# Altium footprint library Inverter_2kW.PcbLib: 61 footprints (part 3 of 4)
Each footprint in its own frame and in the unit in brackets; x right, y up, seen from the top. Pads: shape width x height; smd on the part's side, far side on the other; paste and mask are expansions set on the pad; w line width, h text height; cw(c..) or ccw(c..) is an arc to the next point about the centre after c.
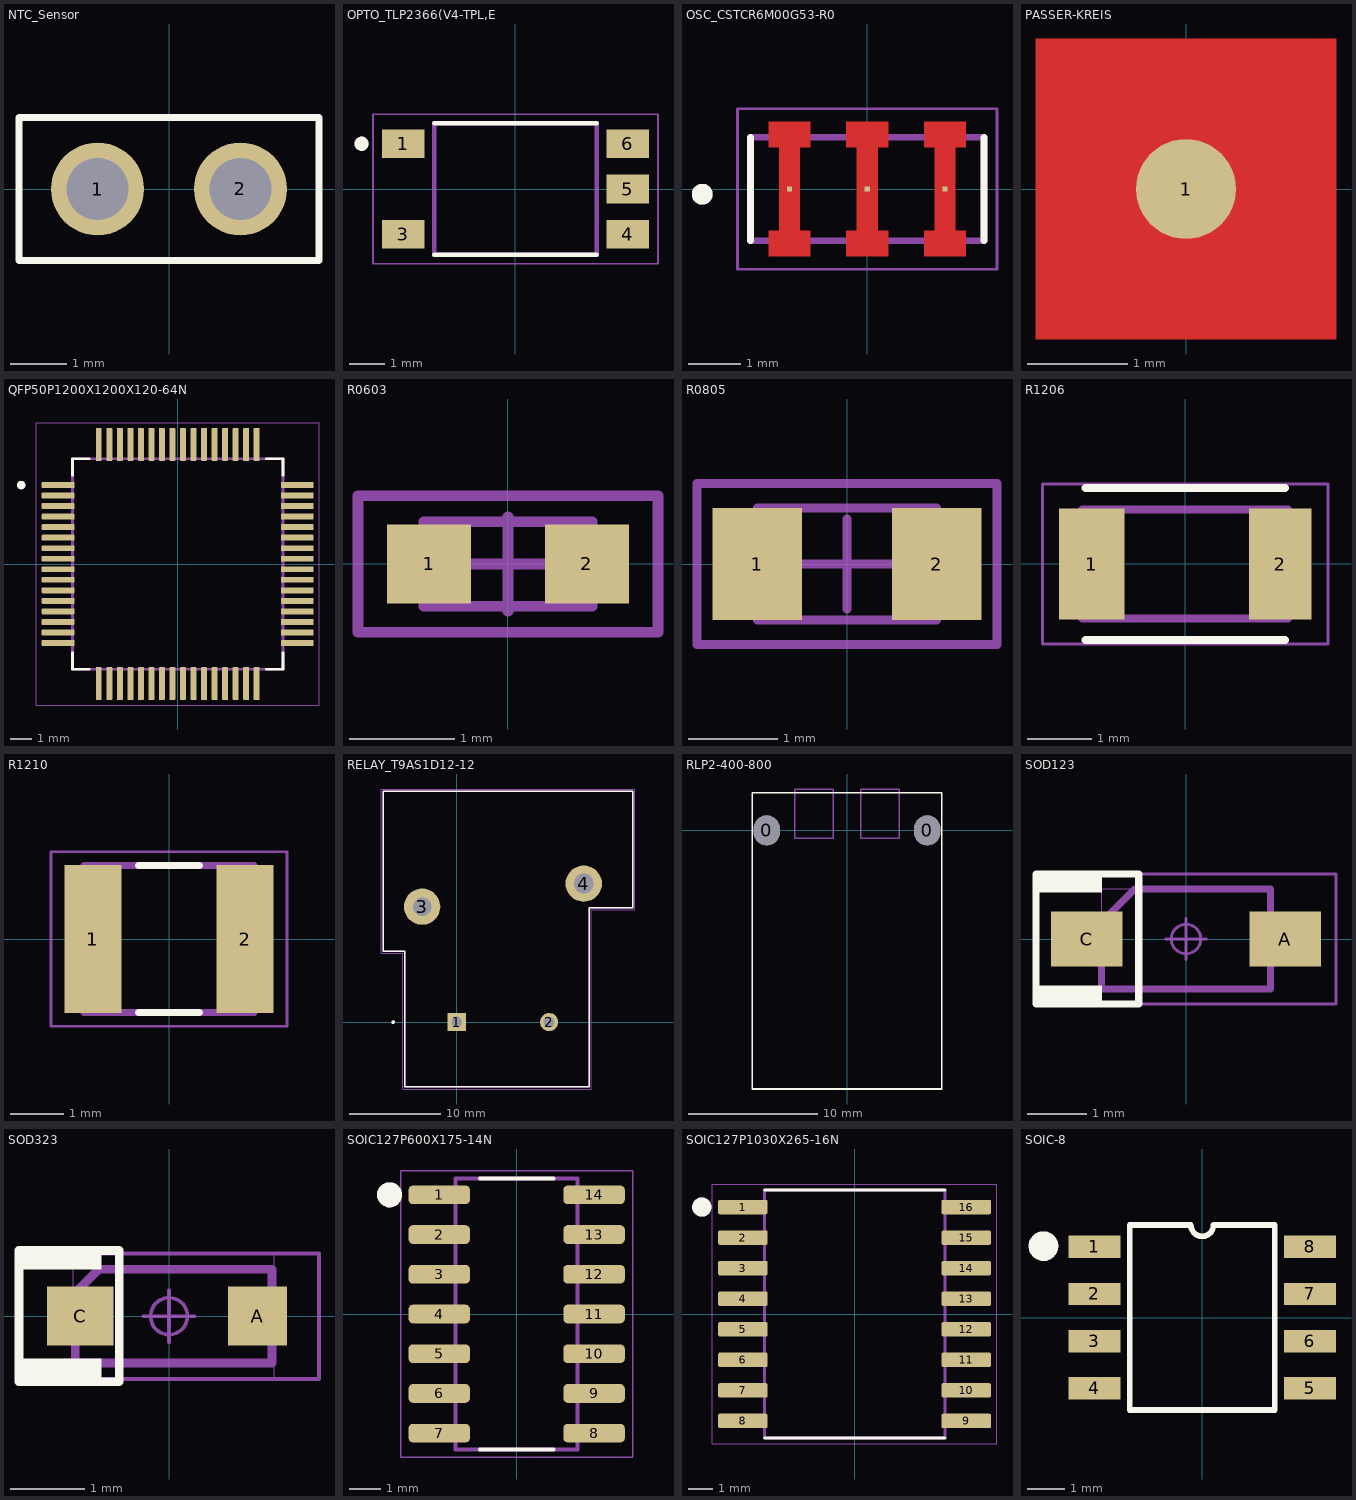
[diagram p2: the footprints below, top view; thin cyan lines are the x and y axes]

## NTC_Sensor [mm]
height 46
pads (2):
  round 1.65 hole 1.1: 1(-1.27,0) 2(1.27,0)
Top Overlay:
  lines w0.127: -2.667,-1.27 2.667,-1.27 2.667,1.27 -2.667,1.27 -2.667,-1.27

## OPTO_TLP2366(V4-TPL,E [mm]
pads (5):
  rect 1.2x0.8 smd: 1(-3.15,1.27) 3(-3.15,-1.27) 4(3.15,-1.27) 5(3.15,0) 6(3.15,1.27)
Top Overlay:
  circle w0.2: c-4.318,1.27 r0.1
  lines w0.127: -2.275,-1.85 2.275,-1.85 ; -2.275,1.85 2.275,1.85
Mechanical 13:
  circle w0.2: c-4.318,1.27 r0.1
  lines w0.127: -2.275,-1.85 2.275,-1.85 2.275,1.85 -2.275,1.85 -2.275,-1.85
Mechanical 15:
  lines w0.05: -4,-2.1 4,-2.1 4,2.1 -4,2.1 -4,-2.1
3D body: height 3, standoff 0.1, extent -2.275,-1.85 2.275,1.85

## OSC_CSTCR6M00G53-R0 [mm]
height 13.5
pads (3):
  rect 0.1x0.1 smd paste+0.35 mask+0.45: 1(-1.5,0) 2(0,0) 3(1.5,0)
Top Layer:
  region: 0.4,0.8 0.2,0.8 0.2,-0.8 0.4,-0.8 0.4,-1.3 -0.4,-1.3 -0.4,-0.8 -0.2,-0.8 -0.2,0.8 -0.4,0.8 -0.4,1.3 0.4,1.3
  region: -1.1,0.8 -1.3,0.8 -1.3,-0.8 -1.1,-0.8 -1.1,-1.3 -1.9,-1.3 -1.9,-0.8 -1.7,-0.8 -1.7,0.8 -1.9,0.8 -1.9,1.3 -1.1,1.3
  region: 1.9,0.8 1.7,0.8 1.7,-0.8 1.9,-0.8 1.9,-1.3 1.1,-1.3 1.1,-0.8 1.3,-0.8 1.3,0.8 1.1,0.8 1.1,1.3 1.9,1.3
Top Overlay:
  circle w0.2: c-3.18,-0.1 r0.1
  lines w0.127: -2.25,-1 -2.25,1 ; 2.25,-1 2.25,1
Mechanical 13:
  circle w0.2: c-3.18,-0.1 r0.1
  lines w0.127: -2.25,-1 2.25,-1 2.25,1 -2.25,1 -2.25,-1
Mechanical 15:
  lines w0.05: -2.5,-1.55 2.5,-1.55 2.5,1.55 -2.5,1.55 -2.5,-1.55
3D body "step_temp.STEP": height 1.2, standoff 0, extent -2.25,-1 2.25,1

## PASSER-KREIS [mm]
height 11.1
pads (1):
  round 1 smd paste-0.5 mask+0.05: 1(0,0)
Top Layer:
  pour cut-out: -1.5,1.5 1.5,1.5 1.5,-1.5 -1.5,-1.5
Top Solder:
  circle w2: c0,0 r0.5
Mechanical 1:
  circle w0.2: c0,0 r0.5

## QFP50P1200X1200X120-64N [mm]
height 13.5
pads (64):
  rrect25% 1.56x0.28 smd: 1(-5.68,3.75) 2(-5.68,3.25) 3(-5.68,2.75) 4(-5.68,2.25) 5(-5.68,1.75) 6(-5.68,1.25) 7(-5.68,0.75) 8(-5.68,0.25) 9(-5.68,-0.25) 10(-5.68,-0.75) 11(-5.68,-1.25) 12(-5.68,-1.75) 13(-5.68,-2.25) 14(-5.68,-2.75) 15(-5.68,-3.25) 16(-5.68,-3.75) 33(5.68,-3.75) 34(5.68,-3.25) 35(5.68,-2.75) 36(5.68,-2.25) 37(5.68,-1.75) 38(5.68,-1.25) 39(5.68,-0.75) 40(5.68,-0.25) 41(5.68,0.25) 42(5.68,0.75) 43(5.68,1.25) 44(5.68,1.75) 45(5.68,2.25) 46(5.68,2.75) 47(5.68,3.25) 48(5.68,3.75)
  rrect25% 0.28x1.56 smd: 17(-3.75,-5.68) 18(-3.25,-5.68) 19(-2.75,-5.68) 20(-2.25,-5.68) 21(-1.75,-5.68) 22(-1.25,-5.68) 23(-0.75,-5.68) 24(-0.25,-5.68) 25(0.25,-5.68) 26(0.75,-5.68) 27(1.25,-5.68) 28(1.75,-5.68) 29(2.25,-5.68) 30(2.75,-5.68) 31(3.25,-5.68) 32(3.75,-5.68) 49(3.75,5.68) 50(3.25,5.68) 51(2.75,5.68) 52(2.25,5.68) 53(1.75,5.68) 54(1.25,5.68) 55(0.75,5.68) 56(0.25,5.68) 57(-0.25,5.68) 58(-0.75,5.68) 59(-1.25,5.68) 60(-1.75,5.68) 61(-2.25,5.68) 62(-2.75,5.68) 63(-3.25,5.68) 64(-3.75,5.68)
Top Overlay:
  circle w0.2: c-7.44,3.75 r0.1
  lines w0.127: -5,-4.21 -5,-5 -4.21,-5 ; -5,4.21 -5,5 -4.21,5 ; 4.21,-5 5,-5 5,-4.21 ; 4.21,5 5,5 5,4.21
Mechanical 13:
  circle w0.2: c-7.44,3.75 r0.1
  lines w0.127: -5,-5 5,-5 5,5 -5,5 -5,-5
Mechanical 15:
  lines w0.05: -6.71,-6.71 6.71,-6.71 6.71,6.71 -6.71,6.71 -6.71,-6.71
3D body "step_temp.STEP": height 1.2, standoff 0, extent -6,-6 6,6

## R0603 [mm] "RESISTOR SMD 0603"
height 0.45
pads (2):
  rect 0.8x0.75 smd: 1(-0.75,0) 2(0.75,0)
Mechanical 13:
  lines w0.1: -0.8,-0.4 -0.8,0.4 0.8,0.4 0.8,-0.4 -0.8,-0.4
Mechanical 15:
  lines w0.1: -0.45,0 0.45,0 ; 0,-0.45 0,0.45 ; -1.425,-0.65 -1.425,0.65 1.425,0.65 1.425,-0.65 -1.425,-0.65
3D body "User Library-0603(1608M) Res.STEP": height 0.79, standoff 0, extent -1,-0.394 1,0.394

## R0805 [mm] "RESISTOR SMD 0805"
height 0.94
pads (2):
  rect 1x1.25 smd: 1(-1,0) 2(1,0)
Mechanical 13:
  lines w0.1: -1,-0.625 -1,0.625 1,0.625 1,-0.625 -1,-0.625
Mechanical 15:
  lines w0.1: -0.5,0 0.5,0 ; 0,-0.5 0,0.5 ; -1.675,-0.9 -1.675,0.9 1.675,0.9 1.675,-0.9 -1.675,-0.9
3D body "User Library-0805(2012M) Res.STEP": height 0.79, standoff 0, extent -1.254,-0.622 1.254,0.622

## R1206 [mm]
height 1.1
pads (2):
  rect 1.02x1.73 smd: 1(-1.455,0)
  rect 0.97x1.73 smd: 2(1.48,0)
Top Overlay:
  lines w0.127: -1.55,-1.18 1.55,-1.18 ; -1.55,1.18 1.55,1.18
Mechanical 13:
  lines w0.127: -1.6,-0.85 1.6,-0.85 1.6,0.85 -1.6,0.85 -1.6,-0.85
Mechanical 15:
  lines w0.05: -2.22,-1.244 2.22,-1.244 2.22,1.244 -2.22,1.244 -2.22,-1.244
3D body "ERJ-8GEY0R00V.STEP": height 0.7, standoff 0, extent -1.6,-0.8 1.6,0.8

## R1210 [mm]
pads (2):
  rect 1.07x2.77 smd: 1(-1.43,0) 2(1.43,0)
Top Overlay:
  lines w0.127: -0.57,-1.38 0.57,-1.38 ; -0.57,1.38 0.57,1.38
Mechanical 13:
  lines w0.127: -1.6,-1.38 -1.6,1.38 1.6,1.38 1.6,-1.38 -1.6,-1.38
Mechanical 15:
  lines w0.05: -2.215,-1.635 -2.215,1.635 2.215,1.635 2.215,-1.635 -2.215,-1.635
3D body "AC1210FR-07280RL.STEP": height 0.65, standoff 0, extent -1.55,-1.3 1.55,1.3

## RELAY_T9AS1D12-12 [mm]
pads (4):
  rect 2x2 hole 1.2: 1(0,0)
  round 2 hole 1.2: 2(10.16,0)
  round 4 hole 2: 3(-3.81,12.7)
  round 4 hole 2.2: 4(13.97,15.24)
Top Overlay:
  circle w0.2: c-7,0 r0.1
  lines w0.152: -8.08,7.8 -8.08,25.4 19.35,25.4 19.35,12.6 14.57,12.6 14.57,-7.11 -5.72,-7.11 -5.72,7.8 -8.08,7.8
Mechanical 13:
  circle w0.2: c-7,0 r0.1
  lines w0.152: -8.08,7.8 -8.08,25.4 19.35,25.4 19.35,12.6 14.57,12.6 14.57,-7.11 -5.72,-7.11 -5.72,7.8 -8.08,7.8
Mechanical 15:
  lines w0.05: -8.33,7.55 -8.33,25.65 19.6,25.65 19.6,12.35 14.82,12.35 14.82,-7.36 -5.97,-7.36 -5.97,7.55 -8.33,7.55
3D body "c-1-1393210-4-k1-3d.stp": height 20, standoff -3.73, extent -8.08,-7.119 19.352,25.4

## RLP2-400-800 [mm]
height 13.5
pads (2):
  oval 2x2.3 hole 2 slot 2.3 at 90 deg: 0(-6.2,0) 0(6.2,0)
Top Overlay:
  lines w0.127: -7.33,-19.979 -7.33,2.921 7.33,2.921 7.33,-19.979 -7.33,-19.979
Mechanical 15:
  lines w0.1: -4.05,-0.6 -4.05,3.2 -1.05,3.2 -1.05,-0.6 -4.05,-0.6 ; 1.05,-0.6 4.05,-0.6 4.05,3.2 1.05,3.2 1.05,-0.6
3D body "BIVAR__INC_RLP2-400-800.step": height 12.71, standoff -2.37, extent -7.33,-19.979 7.33,2.921

## SOD123 [mm]
height 1.35
pads (2):
  rect 1.21x0.93 smd: A(1.68,0) C(-1.68,0)
Top Overlay:
  rectangle: -2.54,0.787 -1.425,1.1
  rectangle: -2.54,-1.1 -1.425,-0.787
  lines w0.12: -2.54,-1.1 -0.8,-1.1 -0.8,1.1 -2.54,1.1 -2.54,-1.1
Mechanical 13:
  lines w0.001: -1.425,-0.85 1.425,-0.85 1.425,0.85 -1.425,0.85 -1.425,-0.85
  lines w0.12: -1.43,-0.85 1.43,-0.85 1.43,0.85 -0.863,0.85 -1.43,0.283 -1.43,-0.85
Mechanical 15:
  circle w0.05: c0,0 r0.25
  lines w0.05: -0.35,0 0.35,0 ; 0,-0.35 0,0.35 ; -2.54,-1.1 -2.54,1.1 2.54,1.1 2.54,-1.1 -2.54,-1.1
3D body "CircuitWorks-SOD123.STEP": height 1.27, standoff 0, extent -1.85,-0.8 1.85,0.8

## SOD323 [mm]
height 1.35
pads (2):
  rect 0.8x0.8 smd: A(1.2,0)
  rect 0.9x0.8 smd: C(-1.2,0)
Top Overlay:
  rectangle: -2.032,0.635 -0.917,0.948
  rectangle: -2.032,-0.889 -0.917,-0.576
  lines w0.12: -2.032,-0.889 -0.673,-0.889 -0.673,0.889 -2.032,0.889 -2.032,-0.889
Mechanical 13:
  lines w0.001: -1.425,-0.85 1.425,-0.85 1.425,0.85 -1.425,0.85 ; -1.298,-0.85 -1.298,0.85
  lines w0.12: -1.397,-0.635 1.397,-0.635 1.397,0.635 -0.951,0.635 -1.27,0.316 -1.27,-0.635
Mechanical 15:
  circle w0.05: c0,0 r0.25
  lines w0.05: -0.35,0 0.35,0 ; 0,-0.35 0,0.35 ; -2.032,-0.85 -2.032,0.85 2.032,0.85 2.032,-0.85 -2.032,-0.85
3D body "PESD1LIN.STEP": height 1.15, standoff 0, extent -1.337,-0.65 1.338,0.65

## SOIC127P600X175-14N [mm]
pads (14):
  rrect50% 1.97x0.6 smd: 1(-2.475,3.81) 2(-2.475,2.54) 3(-2.475,1.27) 4(-2.475,0) 5(-2.475,-1.27) 6(-2.475,-2.54) 7(-2.475,-3.81) 8(2.475,-3.81) 9(2.475,-2.54) 10(2.475,-1.27) 11(2.475,0) 12(2.475,1.27) 13(2.475,2.54) 14(2.475,3.81)
Top Overlay:
  circle w0.4: c-4.064,3.81 r0.2
  lines w0.127: -1.17,-4.325 1.17,-4.325 ; -1.17,4.325 1.17,4.325
Mechanical 13:
  circle w0.4: c-4.064,3.81 r0.2
  lines w0.127: -1.95,-4.325 1.95,-4.325 1.95,4.325 -1.95,4.325 -1.95,-4.325
Mechanical 15:
  lines w0.05: -3.71,-4.575 3.71,-4.575 3.71,4.575 -3.71,4.575 -3.71,-4.575
3D body "TLV9004QDRQ1.STEP": height 1.75, standoff 0, extent -3,-4.332 3,4.318

## SOIC127P1030X265-16N [mm]
pads (16):
  rrect25% 2.06x0.6 smd: 1(-4.64,4.445) 2(-4.64,3.175) 3(-4.64,1.905) 4(-4.64,0.635) 5(-4.64,-0.635) 6(-4.64,-1.905) 7(-4.64,-3.175) 8(-4.64,-4.445) 9(4.64,-4.445) 10(4.64,-3.175) 11(4.64,-1.905) 12(4.64,-0.635) 13(4.64,0.635) 14(4.64,1.905) 15(4.64,3.175) 16(4.64,4.445)
Top Overlay:
  circle w0.4: c-6.35,4.445 r0.2
  lines w0.127: -3.75,-5.15 3.75,-5.15 ; -3.75,5.15 3.75,5.15
Mechanical 13:
  circle w0.4: c-6.35,4.445 r0.2
  lines w0.127: -3.75,-5.15 -3.75,5.15 3.75,5.15 3.75,-5.15 -3.75,-5.15
Mechanical 15:
  lines w0.05: -5.92,-5.4 -5.92,5.4 5.92,5.4 5.92,-5.4 -5.92,-5.4
3D body "ISO7240ADW.STEP": height 2.65, standoff 0, extent -5.15,-5.15 5.15,5.15

## SOIC-8 [mm]
height 1.1
pads (8):
  rect 1.4x0.6 smd: 1(-2.9,1.905) 2(-2.9,0.635) 3(-2.9,-0.635) 4(-2.9,-1.905) 5(2.9,-1.905) 6(2.9,-0.635) 7(2.9,0.635) 8(2.9,1.905)
Top Overlay:
  circle w0.4: c-4.27,1.92 r0.2
  lines w0.152: -1.95,-2.489 -1.95,2.489 -0.305,2.489 ccw(c0,2.489) 0.305,2.489 1.95,2.489 1.95,-2.489 -1.95,-2.489
3D body "STM32G030J6M6.STEP": height 1.75, standoff 0, extent -3.02,-2.45 2.98,2.45